# Altium footprint library pcbSMDv1.PcbLib: 60 footprints (part 2 of 4)
Each footprint in its own frame and in the unit in brackets; x right, y up, seen from the top. Pads: shape width x height; smd on the part's side, far side on the other; paste and mask are expansions set on the pad; w line width, h text height; cw(c..) or ccw(c..) is an arc to the next point about the centre after c.
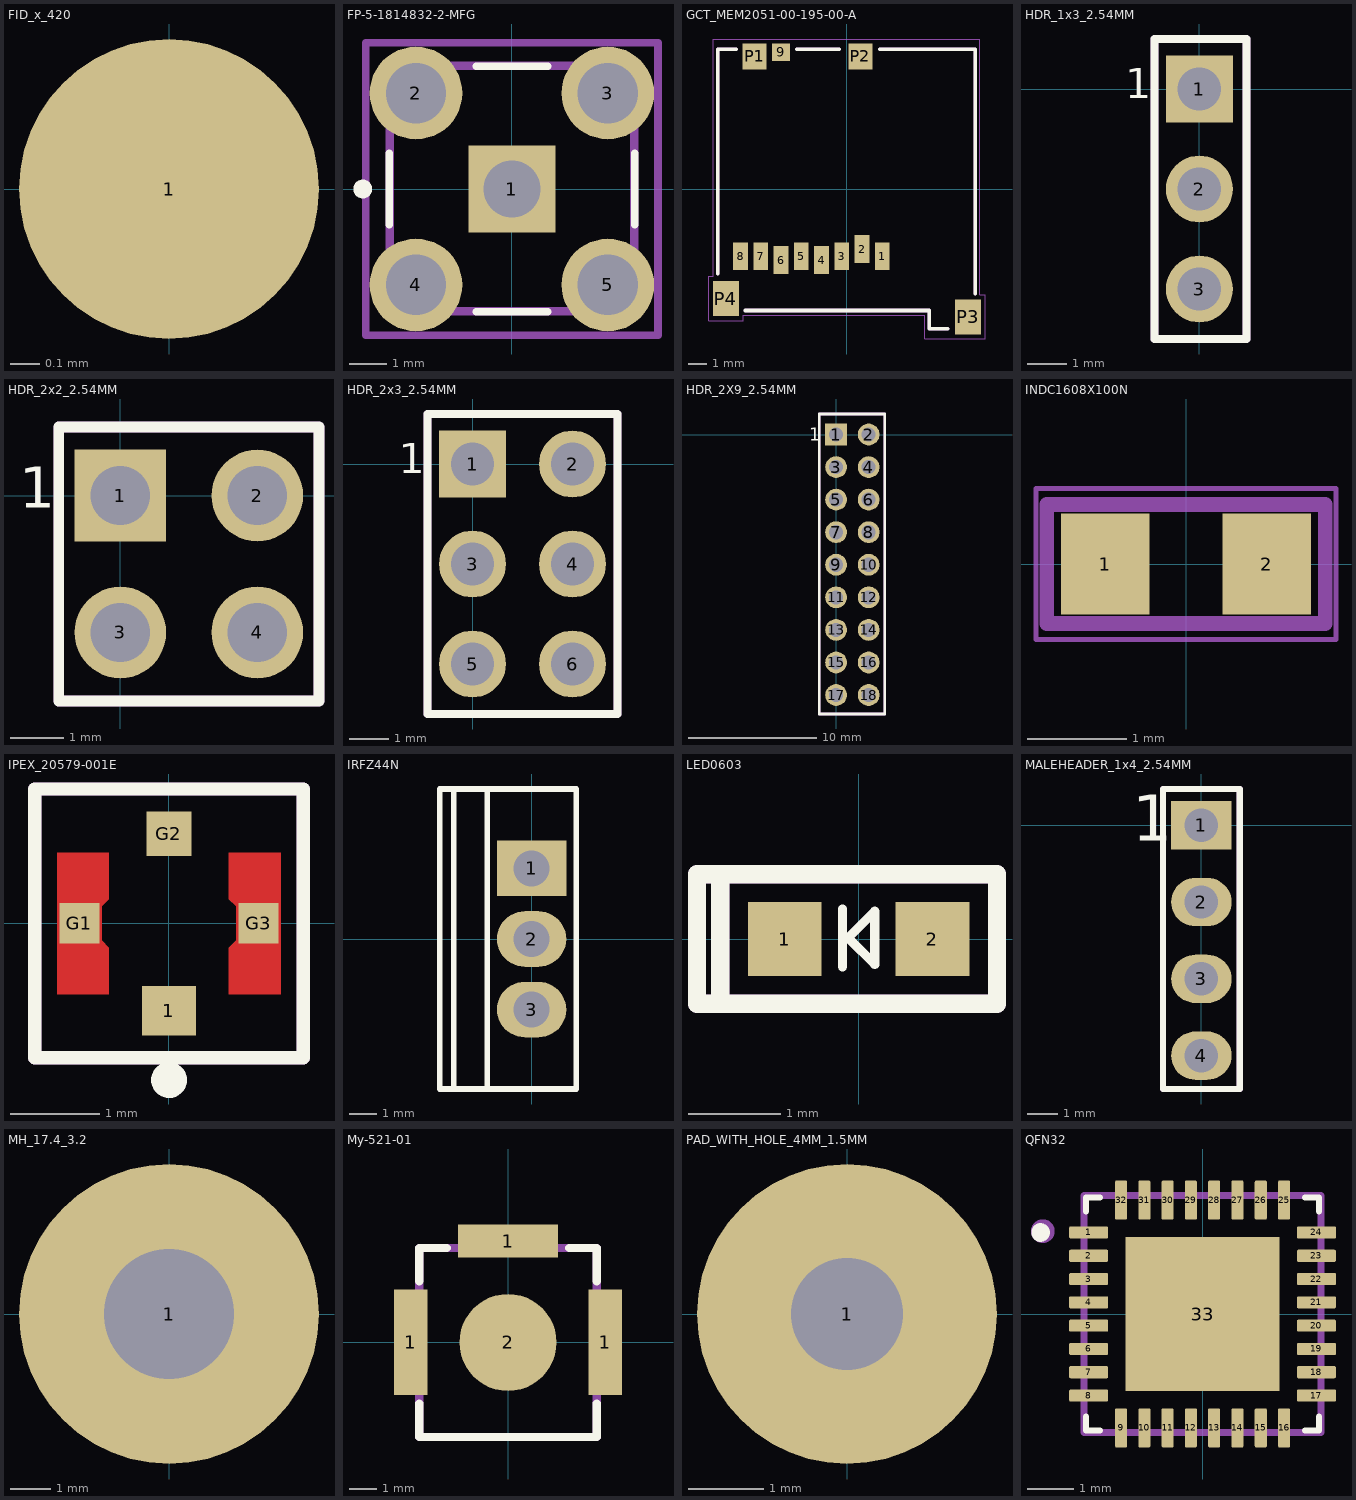
[diagram p1: the footprints below, top view; thin cyan lines are the x and y axes]

## FID_x_420 [mil]
pads (1):
  round 40 smd paste-40 mask+40: 1(0,0)

## FP-5-1814832-2-MFG [mm]
pads (5):
  rect 2.3x2.3 hole 1.5 paste-1000 mask+0: 1(0,0)
  round 2.45 hole 1.6 paste-1000 mask+0: 2(-2.54,2.54) 3(2.54,2.54) 4(-2.54,-2.54) 5(2.54,-2.54)
Top Overlay:
  circle w0.25: c-3.95,0 r0.125
  lines w0.2: -3.25,-0.94 -3.25,0.94 ; -0.94,-3.25 0.94,-3.25 ; -0.94,3.25 0.94,3.25 ; 3.25,-0.94 3.25,0.94
Mechanical 2:
  lines w0.2: -3.25,-3.25 -3.25,3.25 3.25,3.25 3.25,-3.25 -3.25,-3.25
Top Courtyard:
  lines w0.2: -3.865,-3.865 -3.865,3.865 3.865,3.865 3.865,-3.865 -3.865,-3.865
Top Assembly:
  lines w0.2: -3.865,-3.865 -3.865,3.865 3.865,3.865 3.865,-3.865 -3.865,-3.865
  text ".Designator" at 0,0.188 h1
Top Component Center:
  lines w0.1: -0.5,0 0.5,0 ; 0,-0.5 0,0.5
Mechanical 24:
  lines w0.15: -3.2,-3.2 3.2,-3.2 3.2,3.3 -3.2,3.3 -3.2,-3.2
  text ".Designator" at 0.254,0.762 h1.52
3D body "Conn_TE_Connectivity_5-1814832-2_eec.STEP": height 0.25, standoff 0, extent -3.865,-3.865 3.865,3.865

## GCT_MEM2051-00-195-00-A [mm]
pads (13):
  rect 0.8x1.5 smd: 1(1.94,-3.66) 2(0.84,-3.26) 3(-0.26,-3.66) 4(-1.36,-3.86) 5(-2.46,-3.66) 6(-3.56,-3.86) 7(-4.66,-3.66) 8(-5.76,-3.66)
  rect 1x0.95 smd mask+0.08: 9(-3.56,7.425)
  rect 1.3x1.4 smd mask+0.08: P1(-5,7.2)
  rect 1.3x1.4 smd: P2(0.75,7.2)
  rect 1.4x1.9 smd: P3(6.6,-6.95) P4(-6.55,-5.95)
Top Overlay:
  lines w0.2: -7,-4.6 -7,7.6 -6,7.6 ; -5.5,-6.6 4.5,-6.6 4.5,-7.6 5.5,-7.6 ; -2.7,7.6 -0.4,7.6 ; 1.8,7.6 7,7.6 7,-5.7
Mechanical 15:
  lines w0.05: -7.5,-7.15 -5.6,-7.15 -5.6,-6.85 4.25,-6.85 4.25,-8.15 7.55,-8.15 7.55,-5.75 7.25,-5.75 7.25,8.15 -7.25,8.15 -7.25,-4.75 -7.5,-4.75 -7.5,-7.15
Mechanical 24:
  lines w0.2: -7,-4.6 -7,7.6 -6,7.6 ; -5.5,-6.6 4.5,-6.6 4.5,-7.6 5.5,-7.6 ; -2.7,7.6 -0.4,7.6 ; 1.8,7.6 7,7.6 7,-5.7
  text ".Designator" at -1.546,0.062 h1.52
3D body "MEM2051-00-195-00-A.STEP": height 1.95, standoff 0, extent -7,-7.65 7.1,7.65

## HDR_1x3_2.54MM [mm]
pads (3):
  rect 1.7x1.7 hole 1.1: 1(0,0)
  round 1.7 hole 1.1: 2(0,-2.54) 3(0,-5.08)
Top Overlay:
  lines w0.2: -1.143,-6.35 1.2,-6.35 1.2,1.27 -1.143,1.27 -1.143,-6.35
  text "1" at -1.88,-0.229 h0.76
Mechanical 24:
  circle w0.5: c0,0 r0.284
  lines w0.2: -1.143,-6.35 -1.143,1.27 1.2,1.27 1.2,-6.35 -1.143,-6.35
  text ".Designator" at -2.159,-5.08 h1.52
3D body "HDR_1x3_White.stp": height 8.19, standoff -3.31, extent -1.2,-6.11 1.21,1.11

## HDR_2x2_2.54MM [mm]
pads (4):
  rect 1.7x1.7 hole 1.1: 1(0,0)
  round 1.7 hole 1.1: 2(2.54,0) 3(0,-2.54) 4(2.54,-2.54)
Top Overlay:
  lines w0.2: -1.143,-3.81 -1.143,1.27 3.683,1.27 3.683,-3.81 -1.143,-3.81
  text "1" at -1.88,-0.229 h0.76
Mechanical 24:
  circle w0.5: c0,0 r0.284
  lines w0.2: -1.143,-3.81 3.683,-3.81 3.683,1.27 -1.143,1.27 -1.143,-3.81
  text ".Designator" at -2.159,-2.54 h1.52
3D body "961204-6404-XX.stp": height 7.5, standoff -3.8, extent -1.397,-3.77 3.683,1.23

## HDR_2x3_2.54MM [mm]
pads (6):
  rect 1.7x1.7 hole 1.1: 1(0,0)
  round 1.7 hole 1.1: 2(2.54,0) 3(0,-2.54) 4(2.54,-2.54) 5(0,-5.08) 6(2.54,-5.08)
Top Overlay:
  lines w0.2: -1.143,-6.35 -1.143,1.27 3.683,1.27 3.683,-6.35 -1.143,-6.35
  text "1" at -1.88,-0.229 h0.76
Mechanical 24:
  circle w0.5: c0,0 r0.284
  lines w0.2: -1.143,-6.35 3.683,-6.35 3.683,1.27 -1.143,1.27 -1.143,-6.35
  text ".Designator" at -2.159,-5.08 h1.52
3D body "User Library-Header3x2_100_TH.STEP": height 8.45, standoff -2.53, extent -1.269,-6.35 3.811,1.27

## HDR_2X9_2.54MM [mm]
pads (18):
  rect 1.7x1.7 hole 1.1: 1(0,0)
  round 1.7 hole 1.1: 2(2.54,0) 3(0,-2.54) 4(2.54,-2.54) 5(0,-5.08) 6(2.54,-5.08) 7(0,-7.62) 8(2.54,-7.62) 9(0,-10.16) 10(2.54,-10.16) 11(0,-12.7) 12(2.54,-12.7) 13(0,-15.24) 14(2.54,-15.24) 15(0,-17.78) 16(2.54,-17.78) 17(0,-20.32) 18(2.54,-20.32)
Top Overlay:
  lines w0.2: -1.3,-21.8 -1.3,1.6 3.8,1.6 3.8,-21.8 -1.3,-21.8
  text "1" at -2.1,-0.5 h1
Mechanical 24:
  lines w0.2: -1.3,-21.8 3.8,-21.8 3.8,1.6 -1.3,1.6 -1.3,-21.8
  text ".Designator" at -2.087,-14.646 h1
3D body "PPTC092LFBN-RC--3DModel-STEP-269445.STEP": height 8.51, standoff -3.4, extent -1.295,-21.768 3.785,1.6

## INDC1608X100N [mm]
pads (2):
  rect 0.89x1.02 smd: 1(-0.814,0) 2(0.814,0)
Mechanical 15:
  lines w0.05: -1.508,-0.758 1.508,-0.758 1.508,0.758 -1.508,0.758 -1.508,-0.758
Mechanical 24:
  lines w0.15: -1.4,-0.6 1.4,-0.6 1.4,0.6 -1.4,0.6 -1.4,-0.6
  text ".Designator" at 0.254,0.762 h1.52
3D body "LQW18AN27NG00D.STEP": height 1, standoff 0, extent -0.8,-0.4 0.8,0.4

## IPEX_20579-001E [mm]
pads (4):
  rect 0.6x0.55 smd paste-1: 1(0,-0.975)
  rect 0.45x0.45 smd paste-1 mask+0: G1(-1,0) G3(1,0)
  rect 0.5x0.5 smd paste-1: G2(0,1)
Top Layer:
  region: 1.25,-0.79 0.67,-0.79 0.67,-0.27 0.75,-0.19 0.75,0.19 0.67,0.27 0.67,0.79 1.25,0.79
  region: -0.67,0.27 -0.75,0.19 -0.75,-0.19 -0.67,-0.27 -0.67,-0.79 -1.25,-0.79 -1.25,0.79 -0.67,0.79
Top Overlay:
  circle w0.2: c0,-1.75 r0.1
  lines w0.15: -1.5,-1.5 1.5,-1.5 1.5,1.5 -1.5,1.5 -1.5,-1.5
Top Paste:
  region: 1.25,-0.45 0.75,-0.45 0.75,0.45 1.25,0.45
  region: -0.75,-0.45 -1.25,-0.45 -1.25,0.45 -0.75,0.45
  region: 0.18,-1.2 -0.18,-1.2 -0.18,-0.84 0.18,-0.84
  region: 0.19,0.82 -0.19,0.82 -0.19,1.2 0.19,1.2
Top Solder:
  region: -0.57,0.15 -0.65,0.09 -0.65,-0.09 -0.57,-0.15 -0.57,-0.89 -1.35,-0.89 -1.35,0.89 -0.57,0.89
  region: 1.35,-0.89 0.57,-0.89 0.57,-0.15 0.65,-0.09 0.65,0.09 0.57,0.15 0.57,0.89 1.35,0.89
Mechanical 24:
  lines w0.15: -1.5,-1.5 1.5,-1.5 1.5,1.5 -1.5,1.5 -1.5,-1.5
  text ".Designator" at 0.254,0.762 h1.52
3D body "20579-001E--3DModel-STEP-231308.STEP": height 0.6, standoff 0, extent -0.984,-1.082 1.016,0.918

## IRFZ44N [mm]
pads (3):
  rect 2.5x2 hole 1.3: 1(0,2.54)
  oval 2.5x2 hole 1.3: 2(0,0) 3(0,-2.54)
Top Overlay:
  lines w0.2: -2.8,-5.3 -2.8,5.4 ; -1.6,-5.4 -3.3,-5.4 -3.3,5.4 -1.6,5.4 ; -1.6,-5.4 1.6,-5.4 1.6,5.4 -1.6,5.4 ; -1.6,-5.4 -1.6,5.4
3D body "irfz44rpbf.stp": height 23.26, standoff -7.73, extent -3.3,-5.335 1.53,5.335

## LED0603 [mm]
pads (2):
  rect 0.8x0.8 smd: 1(-0.8,0) 2(0.8,0)
Top Overlay:
  lines w0.1: -0.175,-0.3 -0.175,0.325 ; -0.1,0 0.175,-0.275 0.175,0.3 -0.1,0.025 -0.1,0
  lines w0.2: -1.5,-0.7 -1.75,-0.7 -1.75,0.7 -1.5,0.7 ; -1.5,-0.7 -1.5,0 -1.5,0.7 ; -1.5,-0.7 1.5,-0.7 1.5,0.7 -1.5,0.7
Mechanical 24:
  lines w0.2: -1.5,-0.6 -1.5,0.675 ; -1.75,-0.7 1.5,-0.7 1.5,0.7 -1.75,0.7 -1.75,-0.7
  text ".Designator" at -1,1.083 h1
3D body "User Library-LED SMD 0603 super red.STEP": height 0.65, standoff 0, extent -0.85,-0.4 0.85,0.4

## MALEHEADER_1x4_2.54MM [mm]
pads (4):
  rect 2x1.6 hole 1.1: 1(0,0)
  oval 2x1.6 hole 1.1: 2(0,-2.54) 3(0,-5.08) 4(0,-7.62)
Top Overlay:
  lines w0.2: -1.27,-8.724 -1.27,1.2 1.27,1.2 1.27,-8.724 0.635,-8.724 -0.635,-8.724 -1.27,-8.724
  text "1" at -2.286,-0.508 h1.52
Mechanical 24:
  circle w0.5: c0,0 r0.359
  lines w0.2: -1.27,-8.724 1.27,-8.724 ; -1.27,-8.7 -1.27,1.2 1.27,1.2 1.27,-8.7
  text ".Designator" at 0.738,-5.746 h1.52
3D body "HDR_1x4_White.stp": height 8.19, standoff -3.31, extent -1.205,-8.66 1.205,1.1

## MH_17.4_3.2 [mm]
pads (1):
  round 7.4 hole 3.2: 1(0,0)

## My-521-01 [mm]
pads (4):
  rect 1.2x3.8 smd: 1(-3.5,0) 1(3.5,0)
  rect 3.6x1.2 smd: 1(0,3.65)
  round 3.5 smd: 2(0,0)
Top Overlay:
  lines w0.3: -3.2,-2.2 -3.2,-3.4 3.2,-3.4 3.2,-2.2 ; -3.2,2.2 -3.2,3.4 -2.2,3.4 ; 2.2,3.4 3.2,3.4 3.2,2.2
Mechanical 24:
  lines w0.3: -3.2,-3.4 3.2,-3.4 3.2,3.4 -3.2,3.4 -3.2,-3.4
  text ".Designator" at -0.846,-2.738 h1.52
3D body "User Library-SR521.step": height 2.2, standoff 0.05, extent -2.9,-2.9 2.9,2.9

## PAD_WITH_HOLE_4MM_1.5MM [mm]
pads (1):
  round 4 hole 1.5: 1(0,0)

## QFN32 [mm]
pads (33):
  rrect25% 0.84x0.26 smd: 1(-2.445,1.75) 2(-2.445,1.25) 3(-2.445,0.75) 4(-2.445,0.25) 5(-2.445,-0.25) 6(-2.445,-0.75) 7(-2.445,-1.25) 8(-2.445,-1.75) 17(2.445,-1.75) 18(2.445,-1.25) 19(2.445,-0.75) 20(2.445,-0.25) 21(2.445,0.25) 22(2.445,0.75) 23(2.445,1.25) 24(2.445,1.75)
  rrect25% 0.26x0.84 smd: 9(-1.75,-2.445) 10(-1.25,-2.445) 11(-0.75,-2.445) 12(-0.25,-2.445) 13(0.25,-2.445) 14(0.75,-2.445) 15(1.25,-2.445) 16(1.75,-2.445) 25(1.75,2.445) 26(1.25,2.445) 27(0.75,2.445) 28(0.25,2.445) 29(-0.25,2.445) 30(-0.75,2.445) 31(-1.25,2.445) 32(-1.75,2.445)
  rect 3.3x3.3 smd paste-0.605: 33(0,0)
Top Overlay:
  circle w0.2: c-3.475,1.75 r0.1
  lines w0.127: -2.5,-2.2 -2.5,-2.5 -2.2,-2.5 ; -2.5,2.2 -2.5,2.5 -2.2,2.5 ; 2.2,-2.5 2.5,-2.5 2.5,-2.2 ; 2.2,2.5 2.5,2.5 2.5,2.2
Mechanical 24:
  circle w0.254: c-3.429,1.778 r0.127
  lines w0.15: -2.54,-2.54 2.54,-2.54 2.54,2.54 -2.54,2.54 -2.54,-2.54
3D body "ESP8266EX.STEP": height 0.9, standoff 0, extent -2.5,-2.5 2.5,2.5